# Altium footprint library mastermind.PCBLIB: 1061 footprints (part 33 of 67)
Each footprint in its own frame and in the unit in brackets; x right, y up, seen from the top. Pads: shape width x height; smd on the part's side, far side on the other; paste and mask are expansions set on the pad; w line width, h text height; cw(c..) or ccw(c..) is an arc to the next point about the centre after c.
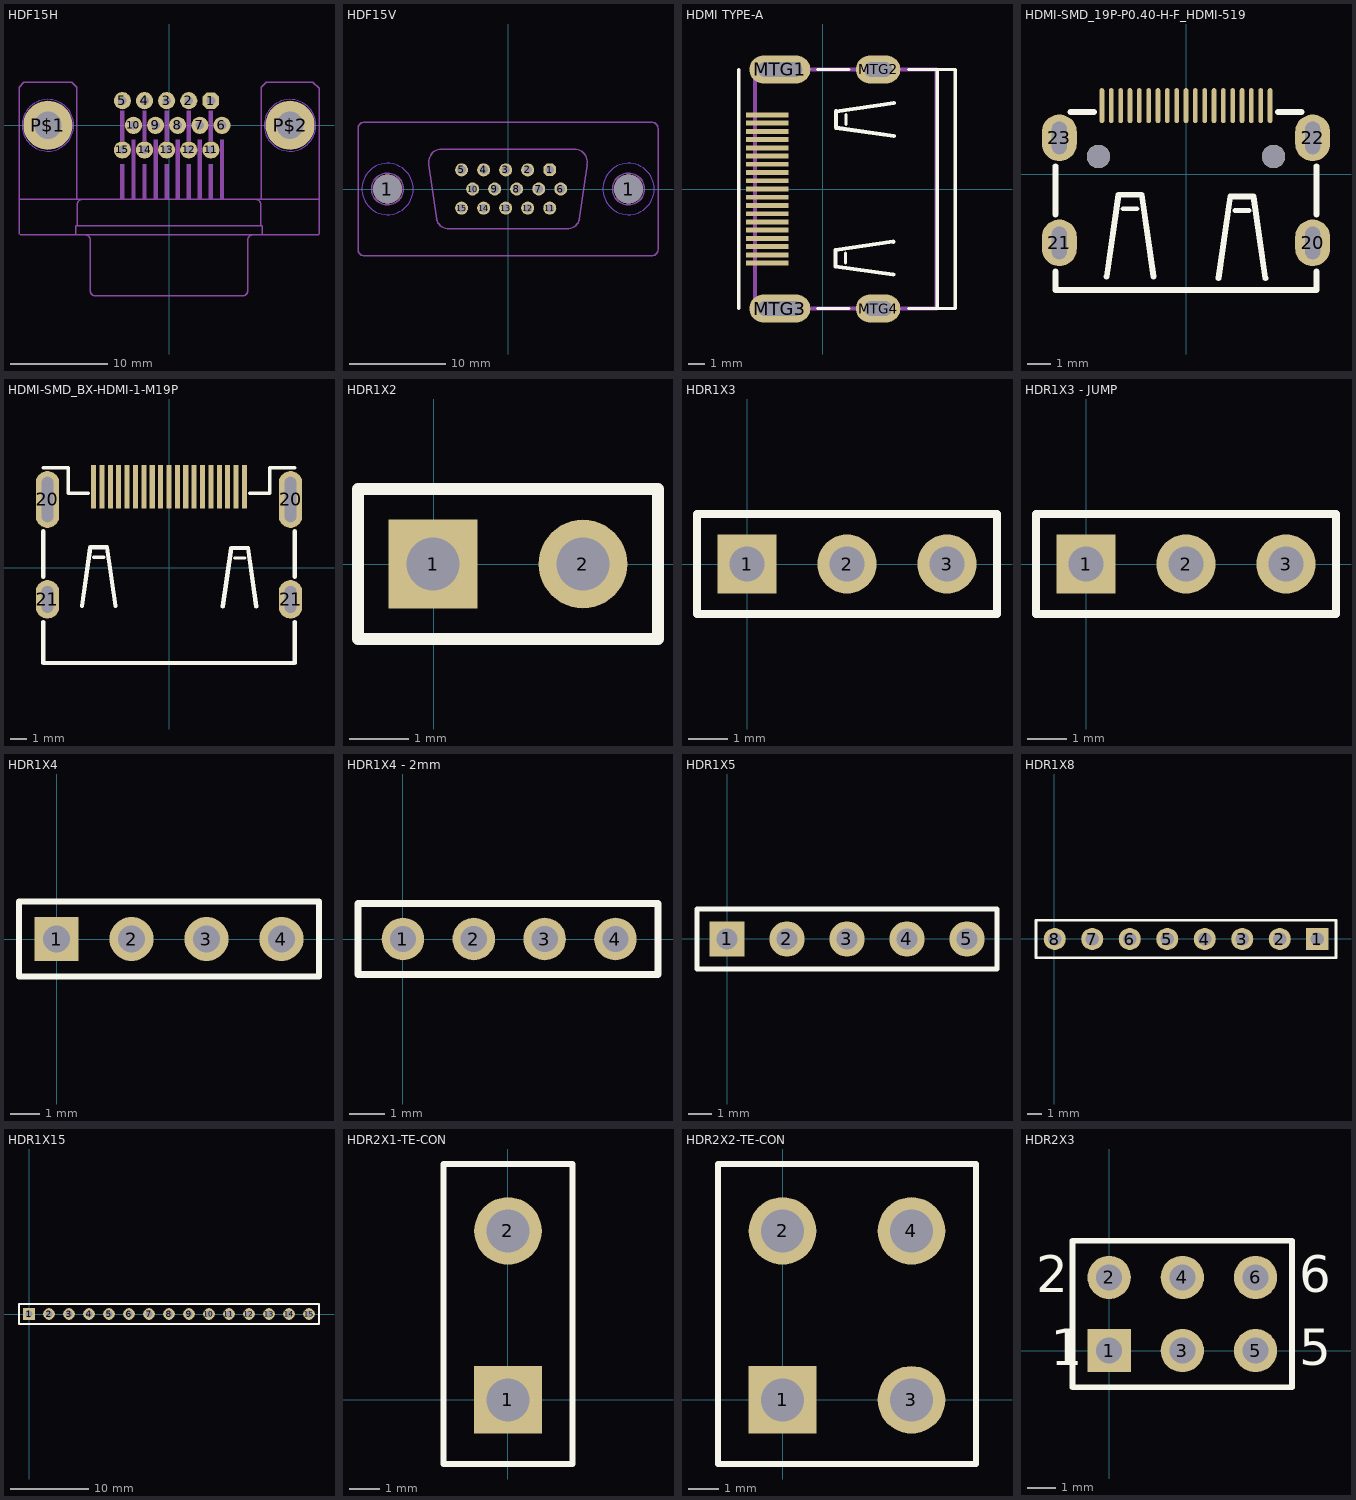
[diagram p32: the footprints below, top view; thin cyan lines are the x and y axes]

## HDF15H [mil]
pads (17):
  oct 67.78x67.78 hole 35.43: 1(170.43,100)
  round 70 hole 35.43: 2(80.43,100) 3(-9.57,100) 4(-99.57,100) 5(-189.57,100) 6(215.43,0) 7(125.43,0) 8(35.43,0) 9(-54.57,0) 10(-144.57,0) 11(170.43,-100) 12(80.43,-100) 13(-9.57,-100) 14(-99.57,-100) 15(-189.57,-100)
  round 200 hole 110.24: P$1(-492.13,0) P$2(492.13,0)
Top Layer keep-out:
  circle w0: c492.13,0 r105
  circle w0: c-492.13,0 r105
Bottom Layer keep-out:
  circle w0: c492.13,0 r105
  circle w0: c-492.13,0 r105
Mechanical 2:
  circle w6: c492.13,0 r65
  circle w6: c-492.13,0 r65
  region: 27.56,-299.21 27.56,-59.06 43.31,-59.06 43.31,-299.21
  region: -62.44,-299.21 -62.44,-59.06 -46.69,-59.06 -46.69,-299.21
  region: -152.44,-299.21 -152.44,-59.06 -136.69,-59.06 -136.69,-299.21
  region: 117.56,-299.21 117.56,-59.06 133.31,-59.06 133.31,-299.21
  region: 207.56,-299.21 207.56,-59.06 223.31,-59.06 223.31,-299.21
  region: -17.44,-299.21 -17.44,-157.48 -1.69,-157.48 -1.69,-299.21
  region: -107.44,-299.21 -107.44,-157.48 -91.69,-157.48 -91.69,-299.21
  region: -197.44,-299.21 -197.44,-157.48 -181.69,-157.48 -181.69,-299.21
  region: 72.56,-299.21 72.56,-157.48 88.31,-157.48 88.31,-299.21
  region: 162.56,-299.21 162.56,-157.48 178.31,-157.48 178.31,-299.21
  region: -197.44,-62.99 -197.44,59.06 -181.69,59.06 -181.69,-62.99
  region: -107.44,-62.99 -107.44,59.06 -91.69,59.06 -91.69,-62.99
  region: -17.44,-62.99 -17.44,59.06 -1.69,59.06 -1.69,-62.99
  region: 72.56,-62.99 72.56,59.06 88.31,59.06 88.31,-62.99
  region: 162.56,-62.99 162.56,59.06 178.31,59.06 178.31,-62.99
  lines w6: -610,-443.94 -610,-300 ; -605.51,-444.65 609.29,-444.65 ; -378.5,-443.94 -378.5,-408.19 -373.5,-408.19 ; -375,-300 -375,155 -395,175 -590,175 -610,155 -610,-300 ; -348.5,-300 ccw(c-348.5,-325) -373.5,-325 -373.5,-408.19 ; -345,-444.25 cw(c-345,-469.25) -320,-469.25 -320,-673.19 ccw(c-300,-673.19) -300,-693.19 300,-693.19 ccw(c300,-673.19) 320,-673.19 320,-469.25 cw(c345,-469.25) 345,-444.25 ; 348.5,-300 cw(c348.5,-325) 373.5,-325 373.5,-408.19 ; 375,-300 375,155 395,175 585,175 610,150 610,-443.94 ; 378.5,-443.94 378.5,-408.19 373.5,-408.19 ; 609.25,-300 -610,-300 ; -373.5,-408.19 373.5,-408.19

## HDF15V [mm]
pads (17):
  round 3 hole 3: 1(-12.5,0) 1(12.5,0)
  oct 1.307x1.307 hole 0.9: 1(4.329,1.98)
  round 1.35 hole 0.9: 2(2.043,1.98) 3(-0.243,1.98) 4(-2.529,1.98) 5(-4.815,1.98) 6(5.472,0) 7(3.186,0) 8(0.9,0) 9(-1.386,0) 10(-3.672,0) 11(4.329,-1.98) 12(2.043,-1.98) 13(-0.243,-1.98) 14(-2.529,-1.98) 15(-4.815,-1.98)
Top Layer keep-out:
  circle w0: c12.5,0 r2.667
  circle w0: c-12.5,0 r2.667
Bottom Layer keep-out:
  circle w0: c12.5,0 r2.667
  circle w0: c-12.5,0 r2.667
Mechanical 2:
  circle w0.152: c12.5,0 r1.651
  circle w0.152: c-12.5,0 r1.651
  lines w0.152: -14.921,-6.923 cw(c-14.921,-6.288) -15.556,-6.288 -15.556,6.288 cw(c-14.921,6.288) -14.921,6.923 14.913,6.923 ; -14.913,-6.923 14.921,-6.923 ccw(c14.921,-6.288) 15.556,-6.288 15.556,6.288 ccw(c14.921,6.288) 14.921,6.923 ; -8.196,2.527 cw(c-6.876,2.791) -6.876,4.137 6.876,4.137 cw(c6.876,2.791) 8.191,2.504 ; -8.197,2.537 -7.409,-3.146 ; -7.417,-3.13 ccw(c-6.114,-2.791) -6.114,-4.137 6.114,-4.137 ccw(c6.114,-2.791) 7.417,-3.13 ; 7.409,-3.121 8.197,2.511

## HDMI TYPE-A [mm]
height 5.51
pads (23):
  rect 2.6x0.3 smd mask+0.025: 1(-3.36,4.5) 2(-3.36,4) 3(-3.36,3.5) 4(-3.36,3) 5(-3.36,2.5) 6(-3.36,2) 7(-3.36,1.5) 8(-3.36,1) 9(-3.36,0.5) 10(-3.36,0) 11(-3.36,-0.5) 12(-3.36,-1) 13(-3.36,-1.5) 14(-3.36,-2) 15(-3.36,-2.5) 16(-3.36,-3) 17(-3.36,-3.5) 18(-3.36,-4) 19(-3.36,-4.5)
  oval 3.7x1.7 hole 0.9 slot 2.7 at 0 deg: MTG1(-2.6,7.25) MTG3(-2.6,-7.25)
  oval 2.7x1.7 hole 0.9 slot 1.7 at 0 deg: MTG2(3.36,7.25) MTG4(3.36,-7.25)
Top Overlay:
  lines w0.2: -5.1,-7.25 -5.1,7.25 ; -0.3,-7.25 1.6,-7.25 ; -0.3,7.25 1.6,7.25 ; 1.379,-4.495 1.379,-3.895 ; 1.413,3.911 1.413,4.512 ; 5.2,-7.25 8.05,-7.25 8.05,7.25 5.2,7.25 ; 6.95,-7.2 6.95,7.25
  lines w0.254: 4.28,-5.195 0.779,-4.695 0.779,-3.695 4.28,-3.195 ; 4.314,3.212 0.814,3.711 0.814,4.711 4.314,5.212
Mechanical 29:
  lines w0.254: -4.1,-7.25 6.9,-7.25 6.9,7.25 -4.1,7.25 -4.1,-7.25
  text ".Designator" at 0.2,1.4 h1.52
Top Designator:
  text ".Designator" at 1.094,5.713 h1.14
3D body "694d119-268-011.stp": height 6.28, standoff -2.05, extent -4.4,-7.5 7.471,7.5

## HDMI-SMD_19P-P0.40-H-F_HDMI-519 [mm]
pads (25):
  oval 0.2x1.5 smd paste-100 mask+0.051: 1(3.6,2.94) 2(3.2,2.94) 3(2.8,2.94) 4(2.4,2.94) 5(2,2.94) 6(1.6,2.94) 7(1.2,2.94) 8(0.8,2.94) 9(0.4,2.94) 10(0,2.94) 11(-0.4,2.94) 12(-0.8,2.94) 13(-1.2,2.94) 14(-1.6,2.94) 15(-2,2.94) 16(-2.4,2.94) 17(-2.8,2.94) 18(-3.2,2.94) 19(-3.6,2.94)
  oval 1.5x2 hole 0.65 slot 1.4 at 90 deg paste-2539.97 mask+0.051: 20(5.425,-2.94) 21(-5.425,-2.94) 22(5.425,1.56) 23(-5.425,1.56)
  round 1 hole 1 unplated paste-2539.97: ""(-3.75,0.76) ""(3.75,0.76)
Top Overlay:
  lines w0.2: -2.697,-1.477 -2.097,-1.477 ; 2.097,-1.554 2.697,-1.554
  lines w0.254: -5.588,-4.157 -5.588,-4.953 5.588,-4.953 5.588,-4.157 ; -5.588,-1.722 -5.588,0.343 ; -4.95,2.667 -3.941,2.667 ; -3.397,-4.377 -2.897,-0.877 -1.897,-0.877 -1.397,-4.377 ; 1.397,-4.454 1.897,-0.954 2.897,-0.954 3.397,-4.454 ; 3.941,2.667 4.95,2.667 ; 5.588,-1.722 5.588,0.343
Top Paste:
  drawing of 23 lines, arcs and shapes, not listed
Mechanical 15:
  circle w0.4: c3.75,0.76 r0.2
  circle w0.4: c-3.75,0.76 r0.2

## HDMI-SMD_BX-HDMI-1-M19P [mm]
pads (23):
  rect 0.3x2.6 smd paste-100 mask+0.05: 1(4.5,4.846) 2(4,4.846) 3(3.5,4.846) 4(3,4.846) 5(2.5,4.846) 6(2,4.846) 7(1.5,4.846) 8(1,4.846) 9(0.5,4.846) 10(0,4.846) 11(-0.5,4.846) 12(-1,4.846) 13(-1.5,4.846) 14(-2,4.846) 15(-2.5,4.846) 16(-3,4.846) 17(-3.5,4.846) 18(-4,4.846) 19(-4.5,4.846)
  oval 1.4x3.4 hole 0.7 slot 2.7 at 90 deg paste-2539.97 mask+0.05: 20(-7.25,4.086) 20(7.25,4.086)
  oval 1.4x2.3 hole 0.7 slot 1.6 at 90 deg paste-2539.97 mask+0.05: 21(-7.25,-1.874) 21(7.25,-1.874)
Top Overlay:
  lines w0.2: -7.5,5.983 -6.02,5.983 -6.02,4.458 -4.81,4.458 ; -4.495,0.631 -3.895,0.631 ; 3.911,0.597 4.512,0.597 ; 4.81,4.458 6.02,4.458 6.02,5.983 7.5,5.983
  lines w0.254: -7.5,-3.221 -7.5,-5.674 7.5,-5.674 7.5,-3.221 ; -7.5,-0.527 -7.5,2.189 ; -5.195,-2.27 -4.695,1.231 -3.695,1.231 -3.195,-2.27 ; 3.212,-2.304 3.711,1.196 4.711,1.196 5.212,-2.304 ; 7.5,-0.527 7.5,2.189
3D body "molex_0471510001.STEP": height 6.23, standoff -2.15, extent -7.52,-6.429 7.48,5.721

## HDR1X2 [mm]
pads (2):
  rect 1.5x1.5 hole 0.9: 1(-0.011,0.007)
  round 1.5 hole 0.9: 2(2.529,0.007)
Top Overlay:
  lines w0.2: -1.281,-1.263 -1.281,1.277 3.799,1.277 3.799,-1.263 -1.281,-1.263
3D body "Header, Male, 2.54mm, 1x2.STEP": height 8.54, standoff -3, extent -1.281,-1.263 3.799,1.277

## HDR1X3 [mm] "Connector; Header; 3 Position"
pads (3):
  rect 1.5x1.5 hole 0.9: 1(0,0)
  round 1.5 hole 0.9: 2(2.54,0) 3(5.08,0)
Top Overlay:
  lines w0.2: -1.27,-1.27 6.35,-1.27 6.35,1.27 -1.27,1.27 -1.27,-1.27
3D body "Header, Male, 2.54mm, 1x3.STEP": height 8.54, standoff -3, extent -1.27,-1.27 6.35,1.27

## HDR1X3 - JUMP [mm] "Connector; Header; 3 Position"
pads (3):
  rect 1.5x1.5 hole 0.9: 1(0,0)
  round 1.5 hole 0.9: 2(2.54,0) 3(5.08,0)
Top Overlay:
  lines w0.2: -1.27,-1.27 6.35,-1.27 6.35,1.27 -1.27,1.27 -1.27,-1.27
3D body "Header, Male, 2.54mm, 1x3.STEP": height 8.54, standoff -3, extent -1.27,-1.27 6.35,1.27
3D body "Pin header jumper.stp": height 8.6, standoff 2.6, extent -1.072,-1.176 3.928,1.324

## HDR1X4 [mm] "Connector; Header; 4 Position"
pads (4):
  rect 1.5x1.5 hole 0.9: 1(0,0)
  round 1.5 hole 0.9: 2(2.54,0) 3(5.08,0) 4(7.62,0)
Top Overlay:
  lines w0.2: -1.27,-1.27 8.89,-1.27 8.89,1.27 -1.27,1.27 -1.27,-1.27
3D body "Header, Male, 2.54mm, 1x4.STEP": height 8.54, standoff -3, extent -1.27,-1.27 8.89,1.27

## HDR1X4 - 2mm [mm] "Connector; Header; 4 Position"
pads (4):
  round 1.2 hole 0.74: 1(0,0) 2(2,0) 3(4,0) 4(6,0)
Top Overlay:
  lines w0.2: -1.27,-1 7.2,-1 7.2,1 -1.27,1 -1.27,-1

## HDR1X5 [mm] "Connector; Header; 5 Position"
pads (5):
  rect 1.5x1.5 hole 0.9: 1(0,0)
  round 1.5 hole 0.9: 2(2.54,0) 3(5.08,0) 4(7.62,0) 5(10.16,0)
Top Overlay:
  lines w0.2: -1.27,-1.27 -1.27,1.27 11.43,1.27 11.43,-1.27 -1.27,-1.27

## HDR1X8 [mm] "DIY MODULE"
pads (8):
  rect 1.5x1.5 hole 0.9: 1(17.8,-0.01)
  round 1.5 hole 0.9: 2(15.26,-0.01) 3(12.72,-0.01) 4(10.18,-0.01) 5(7.64,-0.01) 6(5.1,-0.01) 7(2.56,-0.01) 8(0.02,-0.01)
Top Overlay:
  lines w0.2: -1.25,-1.28 -1.25,1.26 19.07,1.26 19.07,-1.28 -1.25,-1.28

## HDR1X15 [mm] "Connector; Header; 15 Position"
pads (15):
  rect 1.5x1.5 hole 0.9: 1(0,0)
  round 1.5 hole 0.9: 2(2.54,0) 3(5.08,0) 4(7.62,0) 5(10.16,0) 6(12.7,0) 7(15.24,0) 8(17.78,0) 9(20.32,0) 10(22.86,0) 11(25.4,0) 12(27.94,0) 13(30.48,0) 14(33.02,0) 15(35.56,0)
Top Overlay:
  lines w0.2: -1.27,-1.27 36.83,-1.27 36.83,1.27 0.635,1.27 -1.27,1.27 -1.27,-1.27

## HDR2X1-TE-CON [mm] "Connector; Header; 5x2 Position"
height 1.4
pads (2):
  rect 2.2x2.2 hole 1.4: 1(0,0)
  round 2.2 hole 1.4: 2(0,5.5)
Top Overlay:
  lines w0.2: -2.1,7.66 -2.1,-2.09 2.1,-2.09 2.1,7.68 -2.1,7.68

## HDR2X2-TE-CON [mm] "Connector; Header; 5x2 Position"
height 1.4
pads (4):
  rect 2.2x2.2 hole 1.4: 1(0,0)
  round 2.2 hole 1.4: 2(0,5.5) 3(4.2,0) 4(4.2,5.5)
Top Overlay:
  lines w0.2: -2.1,7.66 -2.1,-2.09 6.3,-2.09 6.3,7.68 -2.1,7.68

## HDR2X3 [mm] "Connector; Header; 3x2 Position"
pads (6):
  rect 1.5x1.5 hole 0.9: 1(0,0)
  round 1.5 hole 0.9: 2(0,2.54) 3(2.54,0) 4(2.54,2.54) 5(5.08,0) 6(5.08,2.54)
Top Overlay:
  lines w0.2: 1.482,-1.27 6.35,-1.27 ; 6.35,-1.27 6.35,3.81 -1.27,3.81 -1.27,-1.27 6.35,-1.27
  text "6" at 6.604,2.032 h1.27
  text "5" at 6.604,-0.508 h1.27
  text "2" at -2.54,2.032 h1.27
  text "1" at -2.032,-0.508 h1.27